# Altium schematic symbol library SCHLIB.SchLib: 2608 symbols (part 10 of 20) (continued)
## Q-BC846BDW1T1G (continued)

## Q-BC846BPN,115
designator Q?, comment BC846BPN
TRANS NPN/PNP 65V 0.1A 6TSSOP; Manufacturer 1: Nexperia; Manufacturer Part Number 1: BC846BPN,115; Washability: OK; Supplier 1: Digi-Key; Supplier Part Number 1: 1727-4846-1-ND; Stock 1: 20585; Pricing 1: 1=0.33000, 10=0.26800, 25=0.22400, 100=0.10960, 250=0.10780, 500=0.09138, 1000=0.06350 (USD); RoHS: No; ComponentLink1URL: http://www.mouser.com/ds/2/302/BC846BPN-108518.pdf?src-supplier=Mouser; ComponentLink1Description: http://www.mouser.com/ds/2/302/BC846BPN-108518.pdf?src-supplier=Mouser
footprint TSSOP6(SOT363)
pins: 1, 2, 3, 4, 5, 6

## Q-BC846S
designator Q?, comment BC846S
TRANS 2NPN 65V 0.1A 6TSSOP; Manufacturer: Infineon; VCE (max): 5Â V; ICBO (max): 15Â nA; VEBO (max): 6Â V; IC: 100 mA; Polarity: NPN; VCBO (max): 80Â V; Ptot (max): 250 mV; VCEO (max): 65Â V; Packing: Reel; fT (typ): 250Â MHz; Green: TRUE; ICM (max): 200Â mA; Max Power Dissipation: 250mW; Max Collector Current: 100mA; Collector Base Voltage (VCBO): 80V; Emitter Base Voltage (VEBO): 6V; Collector Emitter Saturation Voltage: 600mV; Max Frequency: 250MHz; Current: 1A; Washability: OK; Mounting Technology: Surface Mount; ComponentLink1Description: Manufacturer URL; Halogen-free: TRUE; PackageDescription: 6-Pin Small Outline Transistor Package, 1.25 x 2 mm Body; ComponentLink1URL: http://www.infineon.com/; PartNumber: BC846S; VCE: 5Â V; ComponentLink3Description: Package Specification; ComponentLink2Description: Datasheet; ComponentLink2URL: http://www.infineon.com/dgdl/bc846s_bc846u_bc847s.pdf?folderId=db3a30431441fb5d0114498f7eab01ce&fileId=db3a30431441fb5d01144990b2e801cf; IC (max): 100 mA; PackageReference: SOT363; ComponentLink3URL: http://www.infineon.com/dgdl/SOT363-Package_Overview.pdf?folderId=db3a30431936bc4b01195360bd8f3cdc&fileId=db3a30431936bc4b0119536b62bf3cf5; Supplier 1: Digi-Key; Supplier Part Number 1: BC846SH6327XTSA1CT-ND; Manufacturer Part Number: BC846S; Stock 1: 21248; Pricing 1: 1=0.37000, 10=0.30700, 100=0.12550, 500=0.10470, 1000=0.07275 (USD); RoHS: Yes; Case/Package: SOT; Number of Pins: 6; Max Operating Temperature: 150°C; Packaging: Tape and Reel; Collector Emitter Voltage (VCEO): 65V; Voltage: 65V; Length: 2mm; Height: 0.8mm; Width: 1.25mm; Halogen Free: Halogen Free; ComponentLink4URL: http://uk.rs-online.com/webdocs/14f5/0900766b814f52b7.pdf?src-supplier=RSComponents; ComponentLink4Description: http://uk.rs-online.com/webdocs/14f5/0900766b814f52b7.pdf?src-supplier=RSComponents
footprint TSSOP6(SOT363)
pins: 1 E1, 2 B1, 3 C2, 4 E2, 5 B2, 6 C1

## Q-BSC093N04LSGATMA1
designator Q?, comment BSC093N04LSGATMA1  Package: TDSON-8
MOSFET N-CH 40V 49A TDSON-8; Manufacturer: Infineon; Rise Time: 2.4ns; Continuous Drain Current (ID): 13A; Rds On Max: 9.3mR; Input Capacitance: 1.9nF; Max Power Dissipation: 35W; Power Dissipation: 2.5W; Turn-On Delay Time: 3.6ns; Turn-Off Delay Time: 16ns; Fall Time: 2.8ns; Gate to Source Voltage (Vgs): 20V; Number of Elements: 1; Washability: OK; Supplier 1: Mouser; Manufacturer Part Number: BSC093N04LSGATMA1; Stock 1: 32240; Pricing 1: 1=0,83000, 10=0,69400, 100=0,44800, 1000=0,35900, 5000=0,35900, 10000=0,35900 (USD); RoHS: Yes; Mount: Surface Mount; Number of Pins: 8; Contact Plating: Tin,Matte; Min Operating Temperature: -55°C; Max Operating Temperature: 150°C; Packaging: Tape and Reel; Drain to Source Voltage (Vdss): 40V; Max Dual Supply Voltage: 40V; Radiation Hardening: No; REACH SVHC: No SVHC; Halogen Free: Halogen Free; Lead Free: Contains Lead; ComponentLink1URL: https://datasheet.ciiva.com/8115/infineon-bsc093n04lsg-ds-v02-01-en-8115122.pdf?src-supplier=Avnet; ComponentLink1Description: https://datasheet.ciiva.com/8115/infineon-bsc093n04lsg-ds-v02-01-en-8115122.pdf?src-supplier=Avnet; ComponentLink2URL: https://datasheet.ciiva.com/8115/infineon-bsc093n04lsg-ds-v02-01-en-8115125.pdf?src-supplier=Avnet; ComponentLink2Description: https://datasheet.ciiva.com/8115/infineon-bsc093n04lsg-ds-v02-01-en-8115125.pdf?src-supplier=Avnet; Supplier Part Number 1: 726-BSC093N04LSG
footprint TDSON-8
pins: 1, 2, 3, 4, 9

## Q-BSP716N
designator Q?, comment BSP716N
MOSFET N-CH 75V 2.3A SOT223; Manufacturer: Infineon Technologies; Manufacturer Part Number: BSP716NH6327XTSA1; Rise Time: 5.5ns; Rds On Max: 160mR; Input Capacitance: 315pF; Max Power Dissipation: 1.8W; Gate to Source Voltage (Vgs): 20V; Washability: OK; ManufacturerPartNumber: BSP716N; PackageReference: PG-SOT223-4; Supplier 1: Digi-Key; Stock 1: 1000; Pricing 1: 1=0.48000, 10=0.41500, 100=0.30980, 500=0.24340 (USD); RoHS: Yes; Mount: Surface Mount; Case/Package: SOT-223; Number of Pins: 4; Contact Plating: Tin; Min Operating Temperature: -55°C; Max Operating Temperature: 150°C; Packaging: Tape and Reel; Drain to Source Voltage (Vdss): 75V; Continuous Drain Current (ID): 2.3A; Max Dual Supply Voltage: 75V; Lead Free: Lead Free; Halogen Free: Halogen Free; ComponentLink1URL: http://www.mouser.com/ds/2/196/Infineon-BSP716N-DS-v02_00-en-535472.pdf?src-supplier=Mouser; ComponentLink1Description: http://www.mouser.com/ds/2/196/Infineon-BSP716N-DS-v02_00-en-535472.pdf?src-supplier=Mouser; ComponentLink2URL: http://www.farnell.com/datasheets/2371093.pdf?src-supplier=Farnell; ComponentLink2Description: http://www.farnell.com/datasheets/2371093.pdf?src-supplier=Farnell; ComponentLink3URL: http://www.infineon.com/dgdl/BSP716N_rev2.0.pdf?folderId=db3a3043156fd573011622e10b5c1f67&fileId=db3a304341c1e4a10141da580f3529e9&src-supplier=Avnet; ComponentLink3Description: http://www.infineon.com/dgdl/BSP716N_rev2.0.pdf?folderId=db3a3043156fd573011622e10b5c1f67&fileId=db3a304341c1e4a10141da580f3529e9&src-supplier=Avnet; ComponentLink4URL: http://www.infineon.com/dgdl/Infineon-BSP716N-DS-v02_00-en.pdf?fileId=db3a304341c1e4a10141da580f3529e9&src-supplier=Digi-Key; ComponentLink4Description: http://www.infineon.com/dgdl/Infineon-BSP716N-DS-v02_00-en.pdf?fileId=db3a304341c1e4a10141da580f3529e9&src-supplier=Digi-Key; ComponentLink5URL: https://www.infineon.com/dgdl/Infineon-BSP716N-DS-v02_00-en.pdf?fileId=db3a304341c1e4a10141da580f3529e9&src-supplier=Digi-Key; ComponentLink5Description: https://www.infineon.com/dgdl/Infineon-BSP716N-DS-v02_00-en.pdf?fileId=db3a304341c1e4a10141da580f3529e9&src-supplier=Digi-Key; Supplier Part Number 1: BSP716NH6327XTSA1CT-ND
footprint SOT223 (SOT,2.30mm pitch;4 pin,3.50mm W X 6.50mm L X 1.70mm H body)
pins: 1 GATE, 2 DRAIN, 3 SOURCE, 4 DRAIN
text: 2, 4

## Q-BSS84W-SOT323
designator Q?, comment BSS84W  Case/Package: SOT-323
MOSFET P-CH 50V 130MA SOT323; Manufacturer: Diodes; Manufacturer Part Number: BSS84W-7-F; Turn-Off Delay Time: 18ns; Turn-On Delay Time: 10ns; Gate to Source Voltage (Vgs): 20V; Nominal Vgs: -1.6V; Input Capacitance: 45pF; Number of Elements: 1; Max Power Dissipation: 200mW; Rds On Max: 10R; Drain to Source Resistance: 6R; Drain to Source Voltage (Vdss): -50V; Element Configuration: Single; Current Rating: -130mA; Washability: OK; Supplier 1: Digi-Key; Supplier Part Number 1: BSS84W-FDIDKR-ND; Stock 1: 301378; Pricing 1: 1=0.5, 10=0.357, 100=0.2102, 500=0.11896, 1000=0.09121 (USD); Mount: Surface Mount; Number of Pins: 3; Weight: 0.000212oz; Contact Plating: Matte,Tin; Min Operating Temperature: -55°C; Max Operating Temperature: 150°C; Continuous Drain Current (ID): 130mA; Packaging: Tape and Reel; Package Quantity: 3000; Power Dissipation: 200mW; Threshold Voltage: -1.6V; Number of Channels: 1; Voltage Rating (DC): -50V; On-State Resistance: 10R; Length: 2.2mm; Height: 1mm; Width: 1.35mm; Radiation Hardening: No; REACH SVHC: No SVHC; Lead Free: Lead Free; ComponentLink1URL: https://www.verical.com/server-webapp/html/getDatasheet?partID=91759; ComponentLink1Description: https://www.verical.com/server-webapp/html/getDatasheet?partID=91759; ComponentLink2URL: http://www.farnell.com/datasheets/1915463.pdf; ComponentLink2Description: http://www.farnell.com/datasheets/1915463.pdf; ComponentLink3URL: http://www.mouser.com/ds/2/115/ds30205-79185.pdf; ComponentLink3Description: http://www.mouser.com/ds/2/115/ds30205-79185.pdf; ComponentLink4URL: http://www.diodes.com//datasheets/ds30205.pdf; ComponentLink4Description: http://www.diodes.com//datasheets/ds30205.pdf; ComponentLink5URL: http://docs-europe.electrocomponents.com/webdocs/14a3/0900766b814a381f.pdf; ComponentLink5Description: http://docs-europe.electrocomponents.com/webdocs/14a3/0900766b814a381f.pdf; ComponentLink6URL: https://www.diodes.com/assets/Datasheets/ds30205.pdf; ComponentLink6Description: https://www.diodes.com/assets/Datasheets/ds30205.pdf; ComponentLink7URL: http://www.jameco.com/Jameco/Products/ProdDS/1539489.pdf; ComponentLink7Description: http://www.jameco.com/Jameco/Products/ProdDS/1539489.pdf
footprint SOT323-3
pins: 1 G, 2 S, 3 D

## Q-CSD13381F4
designator Q?, comment CSD13381F4
MOSFET N-CH 12V 2.1A 3PICOSTAR; Manufacturer: Texas Instruments; Rds On Max: 180mR; Input Capacitance: 200pF; Rise Time: 1.5ns; Max Power Dissipation: 500mW; Gate to Source Voltage (Vgs): 8V; Turn-On Delay Time: 3.7ns; Turn-Off Delay Time: 11ns; Fall Time: 3.8ns; Element Configuration: Single; Number of Channels: 1; Washability: OK; Supplier 1: Digi-Key; Manufacturer Part Number: CSD13381F4; Stock 1: 397961; Pricing 1: 1 = 0.46000, 10 = 0.33400, 100 = 0.19650, 500 = 0.11124, 1000 = 0.08528 (USD); RoHS: Yes; Mount: Surface Mount; Case/Package: QFN; Number of Pins: 3; Min Operating Temperature: -55°C; Max Operating Temperature: 150°C; Package Quantity: 3000; Packaging: Tape and Reel; Drain to Source Voltage (Vdss): 12V; Continuous Drain Current (ID): 2.1A; Drain to Source Breakdown Voltage: 12V; Drain to Source Resistance: 180mR; Number of Elements: 1; Power Dissipation: 500mW; Lead Free: Lead Free; ComponentLink1URL: https://datasheet.ciiva.com/29742/csd13381f4-29742944.pdf?src-supplier=Digi-Key; ComponentLink1Description: https://datasheet.ciiva.com/29742/csd13381f4-29742944.pdf?src-supplier=Digi-Key; ComponentLink2URL: https://datasheet.ciiva.com/30021/csd13381f4-30021964.pdf?src-supplier=Avnet; ComponentLink2Description: https://datasheet.ciiva.com/30021/csd13381f4-30021964.pdf?src-supplier=Avnet; Supplier Part Number 1: 296-38912-1-ND
pins: 1 G, 2 S, 3 D

## Q-CSD19536KTTT
designator Q?, comment CSD19536
MOSFET N-CH 100V 200A TO263; Washability: OK
footprint D2PAK-TO-263
pins: 1 G, 2 S, 3 D

## Q-CSD23285F5T
designator Q?, comment CSD23285F5T
12V P-CHANNEL FEMTOFET MOSFET; Manufacturer: Texas Instruments; Continuous Drain Current (ID): 5.4A; Rds On Max: 35mR; Input Capacitance: 628pF; Max Power Dissipation: 1.4W; Element Configuration: Single; Washability: OK; Manufacturer Part Number: CSD23285F5T; Stock 1: 16944; Pricing 1: 1 = 0.49000, 10 = 0.41600, 100 = 0.31210 (USD); RoHS: Yes; Mount: Surface Mount; Number of Pins: 3; Min Operating Temperature: -55°C; Max Operating Temperature: 150°C; Drain to Source Voltage (Vdss): 12V; Packaging: Cut Tape; Lead Free: Lead Free; ComponentLink1URL: http://www.ti.com/lit/pdf/slra003?src-supplier=Digi-Key; ComponentLink1Description: http://www.ti.com/lit/pdf/slra003?src-supplier=Digi-Key; ComponentLink2URL: http://www.ti.com/lit/ds/symlink/csd23285f5.pdf?src-supplier=Digi-Key; ComponentLink2Description: http://www.ti.com/lit/ds/symlink/csd23285f5.pdf?src-supplier=Digi-Key; Supplier Part Number 1: 296-44809-1-ND; Supplier 1: Digi-Key
footprint 3-XFDFN
pins: 1 G, 2 S, 3 D

## Q-DMP510DL-7
designator Q?, comment DMP510DL-7
MOSFET P-CH 50V 0.18A SOT23; Manufacturer: Diodes; Continuous Drain Current (ID): 180mA; Rds On Max: 10R; Input Capacitance: 24.6pF; Max Power Dissipation: 310mW; Supplier 1: Digi-Key; Supplier Part Number 1: DMP510DL-7DICT-ND; Manufacturer Part Number: DMP510DL-7; Stock: 16501; Pricing: 1=0.38, 10=0.312, 25=0.2612, 100=0.1276, 500=0.1064, 1000=0.074 (USD); RoHS: Yes; Mount: Surface Mount; Case/Package: TO-236-3; Min Operating Temperature: -55°C; Max Operating Temperature: 150°C; Packaging: Tape and Reel; Drain to Source Voltage (Vdss): 50V; ComponentLink1URL: http://www.mouser.com/ds/2/115/DMP510DL-773890.pdf?src-supplier=Mouser; ComponentLink1Description: http://www.mouser.com/ds/2/115/DMP510DL-773890.pdf?src-supplier=Mouser; ComponentLink2URL: http://www.farnell.com/datasheets/2814432.pdf?src-supplier=Farnell; ComponentLink2Description: http://www.farnell.com/datasheets/2814432.pdf?src-supplier=Farnell; ComponentLink3URL: https://www.diodes.com/assets/Datasheets/DMP510DL.pdf?src-supplier=Digi-Key; ComponentLink3Description: https://www.diodes.com/assets/Datasheets/DMP510DL.pdf?src-supplier=Digi-Key
footprint SOT23-3
pins: 1 G, 2 S, 3 D

## Q-DMT6007LFG-7
designator Q?, comment DMT6007LFG-7
MOSFET 60V N-Ch Enh FET 20Vgss 80A 62.5W; Manufacturer: Diodes; Rds On Max: 6mR; Input Capacitance: 2.09nF; Max Power Dissipation: 2.2W; Supplier 1: RSComponents; Manufacturer Part Number: DMT6007LFG-7; Stock 1: 1920; Pricing 1: 10=0,82200, 50=0,67300, 250=0,58600, 500=0,52000, 1000=0,50600, 10=6,32000, 50=5,18000, 250=4,51000, 500=4,00000, 1000=3,89000 (EUR); RoHS: Yes; Mount: Surface Mount; Number of Pins: 8; Min Operating Temperature: -55°C; Max Operating Temperature: 150°C; Continuous Drain Current (ID): 80A; Packaging: Tape and Reel; Drain to Source Voltage (Vdss): 60V; ComponentLink1URL: http://www.mouser.com/ds/2/115/DMT6007LFG-792694.pdf?src-supplier=Mouser; ComponentLink1Description: http://www.mouser.com/ds/2/115/DMT6007LFG-792694.pdf?src-supplier=Mouser; ComponentLink2URL: https://www.diodes.com/assets/Datasheets/DMT6007LFG.pdf?src-supplier=Digi-Key; ComponentLink2Description: https://www.diodes.com/assets/Datasheets/DMT6007LFG.pdf?src-supplier=Digi-Key; Supplier Part Number 1: 1333320
footprint DMT6007LFG-7
pins: 1 S, 2 S, 3 S, 4 G, 5 D, 6 D, 7 D, 8 D

## Q-FDB44N25TM-D2PAK
designator Q?, comment FDB44N25TM  Case/Package: D2PAK
MOSFET N-CH 250V 44A D2PAK; Manufacturer: ON Semiconductor / Fairchild; Max Power Dissipation: 307W; Number of Elements: 1; Rise Time: 400ns; Rds On Max: 69mR; Input Capacitance: 2.87nF; Nominal Vgs: 5V; Fall Time: 115ns; Turn-Off Delay Time: 85ns; Turn-On Delay Time: 55ns; Element Configuration: Single; Gate to Source Voltage (Vgs): 30V; Washability: OK; Supplier 1: Digi-Key; Supplier Part Number 1: FDB44N25TMCT-ND; Manufacturer Part Number: FDB44N25TM; Stock 1: 9278; Pricing 1: 1=3.2, 10=2.894, 100=2.3252 (USD); Mount: Surface Mount; Number of Pins: 2; Weight: 1.31247g; Min Operating Temperature: -55°C; Max Operating Temperature: 150°C; Packaging: Tape and Reel; Package Quantity: 1; Continuous Drain Current (ID): 44A; Drain to Source Breakdown Voltage: 250V; Power Dissipation: 307W; Drain to Source Resistance: 69mR; Drain to Source Voltage (Vdss): 250V; Threshold Voltage: 5V; Voltage Rating (DC): 250V; Current Rating: 44A; On-State Resistance: 69mR; Length: 10.67mm; Height: 4.83mm; Width: 11.33mm; Radiation Hardening: No; REACH SVHC: No SVHC; Lead Free: Lead Free; ComponentLink1URL: http://www.farnell.com/datasheets/2299583.pdf; ComponentLink1Description: http://www.farnell.com/datasheets/2299583.pdf; ComponentLink2URL: http://www.fairchildsemi.com/ds/FD/FDB44N25.pdf; ComponentLink2Description: http://www.fairchildsemi.com/ds/FD/FDB44N25.pdf; ComponentLink3URL: https://www.fairchildsemi.com/datasheets/FD/FDB44N25.pdf; ComponentLink3Description: https://www.fairchildsemi.com/datasheets/FD/FDB44N25.pdf; ComponentLink4URL: http://www.farnell.com/datasheets/1781224.pdf; ComponentLink4Description: http://www.farnell.com/datasheets/1781224.pdf; ComponentLink5URL: http://www.fairchildsemi.com/datasheets/FD/FDB44N25.pdf; ComponentLink5Description: http://www.fairchildsemi.com/datasheets/FD/FDB44N25.pdf
footprint Model Name (Model Description)
footprint D2PAK-TO-263
pins: 1 G, 2 S, 3 D

## Q-FQT2P25TF
designator Q?, comment FQT2P25TF  Continuous Drain Current (ID): 550mA  Drain to Source Voltage (Vdss): 250V
MOSFET P-CH 250V 0.55A SOT-223; Manufacturer: ON Semiconductor / Fairchild; Element Configuration: Single; Drain to Source Breakdown Voltage: -250V; Gate to Source Voltage (Vgs): 30V; Rise Time: 40ns; Rds On Max: 4R; Input Capacitance: 250pF; Current Rating: -550mA; Fall Time: 25ns; Power Dissipation: 2.5W; Turn-Off Delay Time: 12ns; Turn-On Delay Time: 8.5ns; Number of Elements: 1; Supplier 1: Digi-Key; Supplier Part Number 1: FQT2P25TFCT-ND; Manufacturer Part Number: FQT2P25TF; Stock: 2064; Pricing: 1=0.6, 10=0.51, 25=0.4756, 100=0.3533, 250=0.3357, 500=0.2759, 1000=0.2242 (USD); RoHS: Yes; Mount: Surface Mount; Case/Package: SOT-223; Number of Pins: 4; Weight: 0.188g; Min Operating Temperature: -55°C; Max Operating Temperature: 150°C; Package Quantity: 4000; Packaging: Tape and Reel; Voltage Rating (DC): -250V; Drain to Source Resistance: 4R; Max Power Dissipation: 2.5W; Length: 6.7mm; Height: 1.8mm; Width: 3.7mm; Radiation Hardening: No; Lead Free: Lead Free; ComponentLink1URL: https://datasheet.ciiva.com/952/fqt2p25-952984.pdf?src-supplier=Digi-Key; ComponentLink1Description: https://datasheet.ciiva.com/952/fqt2p25-952984.pdf?src-supplier=Digi-Key; ComponentLink2URL: https://datasheet.ciiva.com/29750/fqt2p25-29750954.pdf?src-supplier=Digi-Key; ComponentLink2Description: https://datasheet.ciiva.com/29750/fqt2p25-29750954.pdf?src-supplier=Digi-Key
footprint SOT223 (SOT,2.30mm pitch;4 pin,3.50mm W X 6.50mm L X 1.70mm H body)
pins: 1 GATE, 2 DRAIN, 3 SOURCE, 4 DRAIN
text: 2, 4

## Q-IAUA250N04S6N006AUMA1
designator Q?, comment IAUA250N04S6N006AUMA1
40V, N-Ch, 0.6 mΩ max, Automotive MOSFET, sTOLL, OptiMOS™-6; Manufacturer: Infineon; Supplier 1: Mouser; Supplier Part Number 1: 726-IAUA250N04S6N006; Manufacturer Part Number: IAUA250N04S6N006AUMA1; Stock: 1700; Pricing: 1=2.93, 10=2.49, 100=1.99, 500=1.77, 1000=1.52, 2000=1.48, 4000=1.43, 1=3.46, 10=2.94, 100=2.35, 500=2.09, 1000=1.79, 2000=1.75 (EUR); RoHS: No
footprint HSOF-5
pins: 1 S, 2 S, 3 S, 4 S, 5 G, 6 D

## Q-IRF4905PBF-TO220AB
designator Q?, comment IRF4905  Case/Package: TO-220AB
MOSFET P-CH 55V 74A TO-220AB; Manufacturer: International Rectifier; Manufacturer Part Number: IRF4905PBF; Rds On Max: 20mR; Input Capacitance: 3.4nF; Max Power Dissipation: 200W; Gate to Source Voltage (Vgs): 20V; Turn-On Delay Time: 18ns; Turn-Off Delay Time: 61ns; Drain to Source Breakdown Voltage: -55V; Element Configuration: Single; Recovery Time: 130ns; Nominal Vgs: -4V; Number of Elements: 1; Rise Time: 99ns; Fall Time: 96ns; Current Rating: -74A; Washability: OK; Supplier 1: Digi-Key; Supplier Part Number 1: IRF4905PBF-ND; Stock 1: 8270; Pricing 1: 1=1.9, 10=1.712, 100=1.3761, 500=1.0703, 1000=0.88682 (USD); Mount: Through Hole; Number of Pins: 3; Min Operating Temperature: -55°C; Max Operating Temperature: 175°C; Packaging: Rail/Tube; Drain to Source Voltage (Vdss): 55V; Continuous Drain Current (ID): 74A; Power Dissipation: 200W; Drain to Source Resistance: 20mR; Package Quantity: 50; Dual Supply Voltage: -55V; Termination: Through Hole; Voltage Rating (DC): -55V; Length: 10.54mm; Height: 8.77mm; Width: 4.69mm; Lead Pitch: 2.54mm; Radiation Hardening: No; REACH SVHC: No SVHC; Lead Free: Lead Free; ComponentLink1URL: http://www.irf.com/product-info/datasheets/data/irf4905pbf.pdf; ComponentLink1Description: http://www.irf.com/product-info/datasheets/data/irf4905pbf.pdf; ComponentLink2URL: https://www.distrelec.biz/Web/Downloads/ta/_e/cfIRF4905_Data_E.pdf?mime=application%2Fpdf; ComponentLink2Description: https://www.distrelec.biz/Web/Downloads/ta/_e/cfIRF4905_Data_E.pdf?mime=application%2Fpdf; ComponentLink3URL: https://www.verical.com/server-webapp/html/getDatasheet?partID=144801; ComponentLink3Description: https://www.verical.com/server-webapp/html/getDatasheet?partID=144801; ComponentLink4URL: http://www.farnell.com/datasheets/2043028.pdf; ComponentLink4Description: http://www.farnell.com/datasheets/2043028.pdf; ComponentLink5URL: http://www.mouser.com/ds/2/200/irf4905pbf-220585.pdf; ComponentLink5Description: http://www.mouser.com/ds/2/200/irf4905pbf-220585.pdf; ComponentLink6URL: http://www.jameco.com/Jameco/Products/ProdDS/1559851.pdf; ComponentLink6Description: http://www.jameco.com/Jameco/Products/ProdDS/1559851.pdf
footprint TO-220AB
pins: 1 G, 2 S, 3 D

## Q-IRFL110TRPBF
designator Q?, comment IRFL110TRPBF
MOSFET N-CH 100V 1.5A SOT223; Manufacturer: Vishay; Max Power Dissipation: 2W; Rise Time: 16ns; Input Capacitance: 180pF; Number of Elements: 1; Rds On Max: 540mR; Gate to Source Voltage (Vgs): 20V; Fall Time: 9.4ns; Turn-Off Delay Time: 15ns; Turn-On Delay Time: 6.9ns; Element Configuration: Single; Current: 15A; Washability: OK; Supplier 1: Digi-Key; Manufacturer Part Number: IRFL110TRPBF; Stock 1: 6113; Pricing 1: 1=0.72000, 10=0.63500, 100=0.48650, 500=0.38460, 1000=0.30768 (USD); RoHS: Yes; Mount: Surface Mount; Case/Package: SOT-223; Number of Pins: 3; Weight: 0.008826oz; Contact Plating: Tin,Matte; Min Operating Temperature: -55°C; Max Operating Temperature: 150°C; Drain to Source Voltage (Vdss): 100V; Continuous Drain Current (ID): 1.5A; Drain to Source Breakdown Voltage: 100V; Power Dissipation: 2W; Package Quantity: 1; Packaging: Tape and Reel; Drain to Source Resistance: 540mR; Number of Channels: 1; Voltage: 100V; On-State Resistance: 540mR; Length: 6.7mm; Height: 1.8mm; Width: 3.7mm; Radiation Hardening: No; REACH SVHC: Unknown; Lead Free: Lead Free; ComponentLink1URL: https://datasheet.ciiva.com/30479/0900766b8126cec6-30479774.pdf?src-supplier=RSComponents; ComponentLink1Description: https://datasheet.ciiva.com/30479/0900766b8126cec6-30479774.pdf?src-supplier=RSComponents; ComponentLink2URL: https://datasheet.ciiva.com/34302/1562152-34302494.pdf?src-supplier=Jameco; ComponentLink2Description: https://datasheet.ciiva.com/34302/1562152-34302494.pdf?src-supplier=Jameco; ComponentLink3URL: https://datasheet.ciiva.com/15137/getdatasheetpartid-80948-15137530.pdf?src-supplier=Verical; ComponentLink3Description: https://datasheet.ciiva.com/15137/getdatasheetpartid-80948-15137530.pdf?src-supplier=Verical; ComponentLink4URL: https://datasheet.ciiva.com/23729/1759753-23729811.pdf?src-supplier=Newark; ComponentLink4Description: https://datasheet.ciiva.com/23729/1759753-23729811.pdf?src-supplier=Newark; ComponentLink5URL: https://datasheet.ciiva.com/26789/irfl110trpbf-26789754.pdf?src-supplier=IIIC; ComponentLink5Description: https://datasheet.ciiva.com/26789/irfl110trpbf-26789754.pdf?src-supplier=IIIC; ComponentLink6URL: https://datasheet.ciiva.com/26147/sihfl110-26147656.pdf?src-supplier=Avnet+Europe; ComponentLink6Description: https://datasheet.ciiva.com/26147/sihfl110-26147656.pdf?src-supplier=Avnet+Europe; ComponentLink7URL: https://datasheet.ciiva.com/6387/sihfl110-6387838.pdf?src-supplier=Digi-Key; ComponentLink7Description: https://datasheet.ciiva.com/6387/sihfl110-6387838.pdf?src-supplier=Digi-Key; ComponentLink8URL: https://datasheet.ciiva.com/11161/sihfl110-11161625.pdf?src-supplier=Avnet; ComponentLink8Description: https://datasheet.ciiva.com/11161/sihfl110-11161625.pdf?src-supplier=Avnet; ComponentLink9URL: https://datasheet.ciiva.com/6387/sihfl110-6387836.pdf?src-supplier=Digi-Key; ComponentLink9Description: https://datasheet.ciiva.com/6387/sihfl110-6387836.pdf?src-supplier=Digi-Key; ComponentLink10URL: https://datasheet.ciiva.com/16363/sihfl110-16363717.pdf?src-supplier=Future+Electronics; ComponentLink10Description: https://datasheet.ciiva.com/16363/sihfl110-16363717.pdf?src-supplier=Future+Electronics; Supplier Part Number 1: IRFL110PBFCT-ND
footprint SOT223 (SOT,2.30mm pitch;4 pin,3.50mm W X 6.50mm L X 1.70mm H body)
pins: 1 GATE, 2 DRAIN, 3 SOURCE, 4 DRAIN
text: 2, 4

## Q-IRFS4321TRL7PP
designator Q?, comment IRFS4321  Rds On Max: 14.7mR  Drain to Source Voltage (Vdss): 150V  Continuous Drain Current (ID): 86A
MOSFET N-CH 150V 86A D2PAK; Manufacturer: International Rectifier; Manufacturer Part Number: IRFS4321TRL7PP; Input Capacitance: 4.46nF; Rise Time: 60ns; Max Power Dissipation: 350W; Turn-On Delay Time: 18ns; Turn-Off Delay Time: 25ns; Fall Time: 35ns; Threshold Voltage: 5V; Gate to Source Voltage (Vgs): 30V; Element Configuration: Single; Number of Channels: 1; Drain to Source Resistance: 11.7mR; Washability: OK; Supplier 1: Digi-Key; Stock 1: 0; Pricing 1: 800=1.87600 (USD); RoHS: Yes; Mount: Surface Mount; Case/Package: TO-263-7; Number of Pins: 7; Weight: 0.056438oz; Min Operating Temperature: -55°C; Max Operating Temperature: 175°C; Packaging: Tape and Reel; Package Quantity: 800; Radiation Hardening: No; REACH SVHC: No SVHC; Lead Free: Lead Free; ComponentLink1URL: https://datasheet.ciiva.com/29745/irfs4321-7ppbf-29745000.pdf?src-supplier=Digi-Key; ComponentLink1Description: https://datasheet.ciiva.com/29745/irfs4321-7ppbf-29745000.pdf?src-supplier=Digi-Key; ComponentLink2URL: https://datasheet.ciiva.com/46443/1807912-46443958.pdf?src-supplier=Element14; ComponentLink2Description: https://datasheet.ciiva.com/46443/1807912-46443958.pdf?src-supplier=Element14; Supplier Part Number 1: IRFS4321TRL7PPTR-ND
footprint D2PAK-7
pins: 1 G, 2 S, 3 S, 4 D, 5 S, 6 S, 7 S

## Q-IRLZ44NPBF-TO220AB
designator Q?, comment IRLZ44NPBF  Case/Package: TO-220AB
MOSFET N-CH 55V 47A TO-220AB; Manufacturer: International Rectifier; Rise Time: 84ns; Gate to Source Voltage (Vgs): 16V; Turn-On Delay Time: 11ns; Turn-Off Delay Time: 26ns; Fall Time: 15ns; Input Capacitance: 1.7nF; Max Power Dissipation: 110W; Number of Elements: 1; Rds On Max: 22mR; Drain to Source Resistance: 35mR; Nominal Vgs: 2V; Recovery Time: 120ns; Element Configuration: Single; Washability: OK; Supplier 1: Digi-Key; Manufacturer Part Number: IRLZ44NPBF; Stock 1: 4446; Pricing 1: 1=1.19, 10=1.052, 100=0.8314, 500=0.64476, 1000=0.50903 (USD); Mount: Through Hole; Number of Pins: 3; Min Operating Temperature: -55°C; Max Operating Temperature: 175°C; Continuous Drain Current (ID): 47A; Package Quantity: 50; Packaging: Rail/Tube; Drain to Source Breakdown Voltage: 55V; Power Dissipation: 110W; Drain to Source Voltage (Vdss): 55V; On-State Resistance: 22mR; Dual Supply Voltage: 55V; Voltage Rating (DC): 55V; Current Rating: 47A; Length: 10.54mm; Height: 8.77mm; Width: 4.69mm; Lead Pitch: 2.54mm; Radiation Hardening: No; Lead Free: Lead Free; REACH SVHC: No SVHC; ComponentLink1URL: http://www.jameco.com/Jameco/Products/ProdDS/1563905.pdf?src-supplier=Jameco; ComponentLink1Description: http://www.jameco.com/Jameco/Products/ProdDS/1563905.pdf?src-supplier=Jameco; ComponentLink2URL: http://www.mouser.com/ds/2/200/irlz44npbf-222956.pdf?src-supplier=Mouser; ComponentLink2Description: http://www.mouser.com/ds/2/200/irlz44npbf-222956.pdf?src-supplier=Mouser; ComponentLink3URL: http://www.alliedelec.com/m/d/836a017d84d7b539fecc6816ad6505f3.pdf?src-supplier=Allied+Electronics; ComponentLink3Description: http://www.alliedelec.com/m/d/836a017d84d7b539fecc6816ad6505f3.pdf?src-supplier=Allied+Electronics; ComponentLink4URL: http://www.irf.com/product-info/datasheets/data/irlz44npbf.pdf?src-supplier=Element14; ComponentLink4Description: http://www.irf.com/product-info/datasheets/data/irlz44npbf.pdf?src-supplier=Element14; ComponentLink5URL: https://www.distrelec.biz/Web/Downloads/ta/_e/llIRLZ44N_Data_E.pdf?mime=application%2Fpdf&src-supplier=Distrelec; ComponentLink5Description: https://www.distrelec.biz/Web/Downloads/ta/_e/llIRLZ44N_Data_E.pdf?mime=application%2Fpdf&src-supplier=Distrelec; ComponentLink6URL: http://www.irf.com/product-info/datasheets/data/irlz44npbf.pdf?src-supplier=Avnet; ComponentLink6Description: http://www.irf.com/product-info/datasheets/data/irlz44npbf.pdf?src-supplier=Avnet; ComponentLink7URL: http://www.irf.com/product-info/datasheets/data/irlz44npbf.pdf?src-supplier=Digi-Key; ComponentLink7Description: http://www.irf.com/product-info/datasheets/data/irlz44npbf.pdf?src-supplier=Digi-Key; ComponentLink8URL: http://www.irf.com/product-info/datasheets/data/irlz44npbf.pdf?src-supplier=Future+Electronics; ComponentLink8Description: http://www.irf.com/product-info/datasheets/data/irlz44npbf.pdf?src-supplier=Future+Electronics; ComponentLink9URL: https://www.verical.com/server-webapp/html/getDatasheet?partID=94379&src-supplier=Verical; ComponentLink9Description: https://www.verical.com/server-webapp/html/getDatasheet?partID=94379&src-supplier=Verical; Supplier Part Number 1: IRLZ44NPBF-ND
footprint TO-220_OUTLINE
pins: 1, 2, 3

## Q-IRLZ44NSTRLPBF
designator Q?, comment IRLZ44NSTRLPBF  Case/Package: D2PAK
MOSFET N-CH 55V 47A D2PAK; Manufacturer: International Rectifier; Gate to Source Voltage (Vgs): 16V; Turn-On Delay Time: 11ns; Turn-Off Delay Time: 26ns; Rds On Max: 22mR; Input Capacitance: 1.7nF; Rise Time: 84ns; Element Configuration: Single; Max Power Dissipation: 110W; Drain to Source Resistance: 35mR; Power Dissipation: 3.8W; Fall Time: 15ns; Threshold Voltage: 2V; Number of Elements: 1; Washability: OK; Supplier 1: Mouser; Manufacturer Part Number: IRLZ44NSTRLPBF; Stock 1: 794; Pricing 1: 1=1.31, 10=1.12, 50=1.12, 100=0.861, 1000=0.6, 10000=0.6 (USD); Mount: Surface Mount; Number of Pins: 3; Min Operating Temperature: -55°C; Max Operating Temperature: 175°C; Continuous Drain Current (ID): 47A; Packaging: Tape and Reel; Drain to Source Voltage (Vdss): 55V; Drain to Source Breakdown Voltage: 55V; Package Quantity: 1; Voltage Rating (DC): 55V; Current Rating: 47A; On-State Resistance: 22mR; Length: 10.67mm; Height: 4.83mm; Width: 9.65mm; Radiation Hardening: No; REACH SVHC: Unknown; Lead Free: Lead Free; ComponentLink1URL: http://www.irf.com/product-info/datasheets/data/irlz44ns.pdf?src-supplier=Digi-Key; ComponentLink1Description: http://www.irf.com/product-info/datasheets/data/irlz44ns.pdf?src-supplier=Digi-Key; ComponentLink2URL: https://www.verical.com/server-webapp/html/getDatasheet?partID=79588&src-supplier=Verical; ComponentLink2Description: https://www.verical.com/server-webapp/html/getDatasheet?partID=79588&src-supplier=Verical; ComponentLink3URL: http://www.irf.com/product-info/datasheets/data/irlz44nspbf.pdf?src-supplier=Avnet; ComponentLink3Description: http://www.irf.com/product-info/datasheets/data/irlz44nspbf.pdf?src-supplier=Avnet; ComponentLink4URL: http://www.alliedelec.com/images/products/datasheets/bm/INTERNATIONAL_RECTIFIER/70017122.pdf?src-supplier=Allied+Electronics; ComponentLink4Description: http://www.alliedelec.com/images/products/datasheets/bm/INTERNATIONAL_RECTIFIER/70017122.pdf?src-supplier=Allied+Electronics; ComponentLink5URL: http://www.irf.com/product-info/datasheets/data/irlz44ns.pdf?src-supplier=Element14; ComponentLink5Description: http://www.irf.com/product-info/datasheets/data/irlz44ns.pdf?src-supplier=Element14; ComponentLink6URL: http://www.jameco.com/Jameco/Products/ProdDS/2035442.pdf?src-supplier=Jameco; ComponentLink6Description: http://www.jameco.com/Jameco/Products/ProdDS/2035442.pdf?src-supplier=Jameco; ComponentLink7URL: http://www.irf.com/product-info/datasheets/data/irlz44nspbf.pdf?src-supplier=Avnet+Europe; ComponentLink7Description: http://www.irf.com/product-info/datasheets/data/irlz44nspbf.pdf?src-supplier=Avnet+Europe; Supplier Part Number 1: 942-IRLZ44NSTRLPBF
footprint D2PAK-TO-263
pins: 1 G, 2 S, 3 D

## Q-IXFA12N50P
designator Q?, comment IXFA12N50P
MOSFET N-CH 500V 12A D2-PAK; Manufacturer: IXYS; Element Configuration: Single; Gate to Source Voltage (Vgs): 30V; Rds On Max: 500mR; Input Capacitance: 1.83nF; Rise Time: 27ns; Max Power Dissipation: 200W; Fall Time: 20ns; Turn-Off Delay Time: 65ns; Number of Elements: 1; Supplier 1: Mouser; Supplier Part Number 1: 747-IXFA12N50P; Manufacturer Part Number: IXFA12N50P; Stock: 1059; Pricing: 1=2.75, 10=2.33, 100=1.87, 500=1.66, 1000=1.44, 2500=1.39 (USD); RoHS: Yes; Mount: Surface Mount; Case/Package: TO-263; Min Operating Temperature: -55°C; Max Operating Temperature: 150°C; Package Quantity: 50; Packaging: Rail/Tube; Voltage Rating (DC): 500V; Current Rating: 12A; Drain to Source Voltage (Vdss): 500V; Continuous Drain Current (ID): 12A; Drain to Source Breakdown Voltage: 500V; Power Dissipation: 200W; Drain to Source Resistance: 500mR; Radiation Hardening: No; Lead Free: Lead Free; ComponentLink1URL: https://datasheet.ciiva.com/26948/getdatasheetpartid-754491-26948596.pdf?src-supplier=Verical; ComponentLink1Description: https://datasheet.ciiva.com/26948/getdatasheetpartid-754491-26948596.pdf?src-supplier=Verical
footprint D2PAK-TO-263
pins: 1 G, 2 S, 3 D

## Q-IXFT170N25X3HV
designator Q?, comment IXFT170N25X3HV
MOSFET N-CH 250V 170A TO268HV; Manufacturer: IXYS; Rds On Max: 7.4mR; Input Capacitance: 13.5nF; Max Power Dissipation: 960W; Supplier 1: Digi-Key; Manufacturer Part Number: IXFT170N25X3HV; Stock 1: 411; Pricing 1: 1=14,34000, 10=13,18200, 25=12,63560, 100=10,92800, 500=9,90350, 1000=9,08390, 2500=8,53750, 5000=8,19600 (USD); RoHS: No; Mount: Surface Mount; Min Operating Temperature: -55°C; Max Operating Temperature: 150°C; Packaging: Rail/Tube; Drain to Source Voltage (Vdss): 250V; Continuous Drain Current (ID): 170A; ComponentLink1URL: http://ixapps.ixys.com/DataSheet/DS100809C(IXFT-FH--FK170N25X3-HV_).pdf?src-supplier=Digi-Key; ComponentLink1Description: http://ixapps.ixys.com/DataSheet/DS100809C(IXFT-FH--FK170N25X3-HV_).pdf?src-supplier=Digi-Key; Case/Package: TO-268-3; Supplier Part Number 1: IXFT170N25X3HV-ND
footprint TO-268AA
pins: 1 G, 2 S, 3 D

## Q-IXTA44P15TTRL
designator Q?, comment IXTA44P15TTRL
MOSFET P-CH 150V 44A TO-263; Manufacturer: IXYS; Rds On Max: 65mR; Input Capacitance: 13.4nF; Max Power Dissipation: 298W; Washability: OK; Supplier 1: Digi-Key; Supplier Part Number 1: IXTA44P15TTRLDKR-ND; Manufacturer Part Number: IXTA44P15TTRL; Stock 1: 2743; Pricing 1: 1=5.05, 10=4.506, 100=3.6951 (USD); Mount: Surface Mount; Case/Package: TO-263-4; Min Operating Temperature: -55°C; Max Operating Temperature: 150°C; Package Quantity: 800; Packaging: Tape and Reel; Drain to Source Voltage (Vdss): 150V; Continuous Drain Current (ID): 44A; Lead Free: Lead Free; ComponentLink1URL: http://ixapps.ixys.com/DataSheet/DS100023B(IXTA-TH-TQ-TP44P15T).pdf?src-supplier=Digi-Key; ComponentLink1Description: http://ixapps.ixys.com/DataSheet/DS100023B(IXTA-TH-TQ-TP44P15T).pdf?src-supplier=Digi-Key
footprint D2PAK-TO-263
pins: 1 G, 2 S, 3 D

## Q-MCT06P10-TP
designator Q?, comment MCT06P10
P-channel MOSFET SOT-223; Manufacturer: MCC; Manufacturer Part Number: MCT06P10-TP; Washability: OK; Supplier 1: Digi-Key; Stock 1: 29944; Pricing 1: 1=0.59000, 10=0.49400, 100=0.37080, 500=0.27192, 1000=0.21012 (USD); RoHS: No; Supplier Part Number 1: MCT06P10-TPMSCT-ND
footprint SOT223 (SOT,2.30mm pitch;4 pin,3.50mm W X 6.50mm L X 1.70mm H body)
pins: 1 GATE, 2 DRAIN, 3 SOURCE, 4 DRAIN
text: 2, 4

## Q-MMBT5550L
designator Q?, comment MMBT5550L  Case/Package: SOT-23-3
TRANS NPN 160V 600mA; Manufacturer: ON Semiconductor; Manufacturer Part Number 1: MMBT5550LT1G; Max Power Dissipation: 225mW; Collector Emitter Voltage (VCEO): 140V; hFE Min: 60; Emitter Base Voltage (VEBO): 6V; Collector Emitter Saturation Voltage: 150mV; Element Configuration: Single; Number of Elements: 1; Power Dissipation: 300mW; Type: General Purpose; Supplier 1: Digi-Key; Stock 1: 125354; Pricing 1: 1=0,18000, 10=0,16400, 25=0,15640, 100=0,06880, 500=0,05400, 1000=0,03750 (USD); RoHS: Yes; Number of Pins: 3; Weight: 0.01lb; Contact Plating: Tin,Matte; Min Operating Temperature: -55°C; Max Operating Temperature: 150°C; Package Quantity: 1; Packaging: Tape and Reel; Max Collector Current: 600mA; Collector Emitter Breakdown Voltage: 140V; Polarity: NPN; Collector Base Voltage (VCBO): 160V; Voltage Rating (DC): 140V; Current Rating: 600mA; Max Breakdown Voltage: 140V; Length: 3.04mm; Height: 1.01mm; Width: 1.4mm; Radiation Hardening: No; Lead Free: Lead Free; REACH SVHC: No SVHC; ComponentLink1URL: https://datasheet.ciiva.com/30480/0900766b81276ae6-30480440.pdf?src-supplier=RSComponents; ComponentLink1Description: https://datasheet.ciiva.com/30480/0900766b81276ae6-30480440.pdf?src-supplier=RSComponents; ComponentLink2URL: https://datasheet.ciiva.com/15139/getdatasheetpartid-82697-15139081.pdf?src-supplier=Verical; ComponentLink2Description: https://datasheet.ciiva.com/15139/getdatasheetpartid-82697-15139081.pdf?src-supplier=Verical; ComponentLink3URL: https://datasheet.ciiva.com/976/mmbt5550lt1-d-976514.pdf?src-supplier=Digi-Key; ComponentLink3Description: https://datasheet.ciiva.com/976/mmbt5550lt1-d-976514.pdf?src-supplier=Digi-Key; ComponentLink4URL: https://datasheet.ciiva.com/976/mmbt5550lt1-d-976515.pdf?src-supplier=Digi-Key; ComponentLink4Description: https://datasheet.ciiva.com/976/mmbt5550lt1-d-976515.pdf?src-supplier=Digi-Key; ComponentLink5URL: https://datasheet.ciiva.com/976/mmbt5550lt1-d-976516.pdf?src-supplier=Digi-Key; ComponentLink5Description: https://datasheet.ciiva.com/976/mmbt5550lt1-d-976516.pdf?src-supplier=Digi-Key; ComponentLink6URL: https://datasheet.ciiva.com/16478/mmbt5550lt1-d-16478566.pdf?src-supplier=Avnet+Asia; ComponentLink6Description: https://datasheet.ciiva.com/16478/mmbt5550lt1-d-16478566.pdf?src-supplier=Avnet+Asia; ComponentLink7URL: https://datasheet.ciiva.com/16202/mmbt5550lt1-d-16202395.pdf?src-supplier=Future+Electronics; ComponentLink7Description: https://datasheet.ciiva.com/16202/mmbt5550lt1-d-16202395.pdf?src-supplier=Future+Electronics; ComponentLink8URL: https://datasheet.ciiva.com/7972/mmbt5550lt1-d-7972397.pdf?src-supplier=Element14; ComponentLink8Description: https://datasheet.ciiva.com/7972/mmbt5550lt1-d-7972397.pdf?src-supplier=Element14; Supplier Part Number 1: MMBT5550LT1GOSCT-ND
footprint SOT23-3
pins: 1, 2, 3

## Q-MMBTA06
designator Q?, comment MMBTA06  Case/Package: SOT-23-3
TRANS NPN 80V 0.5A SOT23; Manufacturer: ON Semiconductor; Manufacturer Part Number: MMBTA06LT1G; Max Power Dissipation: 225mW; Number of Elements: 1; Frequency: 100MHz; Emitter Base Voltage (VEBO): 4V; Collector Emitter Saturation Voltage: 250mV; Max Collector Current: 500mA; Power Dissipation: 300mW; Element Configuration: Single; hFE Min: 100; ComponentLink1URL: http://www.fairchildsemi.com/ds/MM/MMBTA06.pdf; ComponentLink1Description: http://www.fairchildsemi.com/ds/MM/MMBTA06.pdf; ComponentLink2URL: http://www.farnell.com/datasheets/48137.pdf; ComponentLink2Description: http://www.farnell.com/datasheets/48137.pdf; ComponentLink3URL: http://www.farnell.com/datasheets/1852077.pdf; ComponentLink3Description: http://www.farnell.com/datasheets/1852077.pdf; ComponentLink4URL: http://www.fairchildsemi.com/datasheets/MP/MPSA06.pdf; ComponentLink4Description: http://www.fairchildsemi.com/datasheets/MP/MPSA06.pdf; ComponentLink5URL: http://www.mouser.com/ds/2/149/MMBTA06-196120.pdf; ComponentLink5Description: http://www.mouser.com/ds/2/149/MMBTA06-196120.pdf; ComponentLink6URL: https://www.verical.com/server-webapp/html/getDatasheet?partID=130058; ComponentLink6Description: https://www.verical.com/server-webapp/html/getDatasheet?partID=130058; Supplier 1: Digi-Key; Supplier Part Number 1: MMBTA06LT1GOSCT-ND; Stock: 165416; Pricing: 1=0.16, 10=0.15, 25=0.1424, 100=0.0627, 250=0.0602, 500=0.0492, 1000=0.0342 (USD); RoHS: Yes; Number of Pins: 3; Contact Plating: Tin,Matte; Min Operating Temperature: -55°C; Max Operating Temperature: 150°C; Package Quantity: 1; Collector Emitter Voltage (VCEO): 80V; Packaging: Tape and Reel; Polarity: NPN; Collector Base Voltage (VCBO): 80V; Collector Emitter Breakdown Voltage: 80V; Transition Frequency: 100MHz; Max Breakdown Voltage: 80V; Max Frequency: 100MHz; Gain Bandwidth Product: 100MHz; Voltage Rating (DC): 80V; Current Rating: 500mA; Length: 0.119inch; Height: 0.04inch; Width: 0.055inch; Radiation Hardening: No; REACH SVHC: No SVHC; Lead Free: Lead Free; ComponentLink7URL: https://datasheet.ciiva.com/4722/mmbta05lt1-d-101659-4722113.pdf?src-supplier=Mouser; ComponentLink7Description: https://datasheet.ciiva.com/4722/mmbta05lt1-d-101659-4722113.pdf?src-supplier=Mouser; ComponentLink8URL: https://datasheet.ciiva.com/15139/getdatasheetpartid-137838-15139444.pdf?src-supplier=Verical; ComponentLink8Description: https://datasheet.ciiva.com/15139/getdatasheetpartid-137838-15139444.pdf?src-supplier=Verical; ComponentLink9URL: https://datasheet.ciiva.com/16465/mmbta05lt1-d-16465685.pdf?src-supplier=Future+Electronics; ComponentLink9Description: https://datasheet.ciiva.com/16465/mmbta05lt1-d-16465685.pdf?src-supplier=Future+Electronics; ComponentLink10URL: https://datasheet.ciiva.com/11197/mmbta05lt1-d-11197414.pdf?src-supplier=Avnet; ComponentLink10Description: https://datasheet.ciiva.com/11197/mmbta05lt1-d-11197414.pdf?src-supplier=Avnet; ComponentLink11URL: https://datasheet.ciiva.com/11198/mmbta05lt1-d-11198678.pdf?src-supplier=Avnet; ComponentLink11Description: https://datasheet.ciiva.com/11198/mmbta05lt1-d-11198678.pdf?src-supplier=Avnet; ComponentLink12URL: https://datasheet.ciiva.com/976/mmbta05lt1-d-976473.pdf?src-supplier=Digi-Key; ComponentLink12Description: https://datasheet.ciiva.com/976/mmbta05lt1-d-976473.pdf?src-supplier=Digi-Key; ComponentLink13URL: https://datasheet.ciiva.com/976/mmbta05lt1-d-976474.pdf?src-supplier=Digi-Key; ComponentLink13Description: https://datasheet.ciiva.com/976/mmbta05lt1-d-976474.pdf?src-supplier=Digi-Key; ComponentLink14URL: https://datasheet.ciiva.com/976/mmbta05lt1-d-976475.pdf?src-supplier=Digi-Key; ComponentLink14Description: https://datasheet.ciiva.com/976/mmbta05lt1-d-976475.pdf?src-supplier=Digi-Key; ComponentLink15URL: https://datasheet.ciiva.com/7972/mmbta05lt1-d-7972078.pdf?src-supplier=Element14; ComponentLink15Description: https://datasheet.ciiva.com/7972/mmbta05lt1-d-7972078.pdf?src-supplier=Element14; ComponentLink16URL: https://datasheet.ciiva.com/16478/mmbta05lt1-d-16478574.pdf?src-supplier=Avnet+Asia; ComponentLink16Description: https://datasheet.ciiva.com/16478/mmbta05lt1-d-16478574.pdf?src-supplier=Avnet+Asia; ComponentLink17URL: https://datasheet.ciiva.com/25998/mmbta05lt1-d-25998830.pdf?src-supplier=Avnet+Europe; ComponentLink17Description: https://datasheet.ciiva.com/25998/mmbta05lt1-d-25998830.pdf?src-supplier=Avnet+Europe